# Altium schematic symbol library Capacitor - Ceramic - Sumsung.SchLib: 1421 symbols (part 7 of 8) (continued)
## CL31C270JHFNNNE (continued)
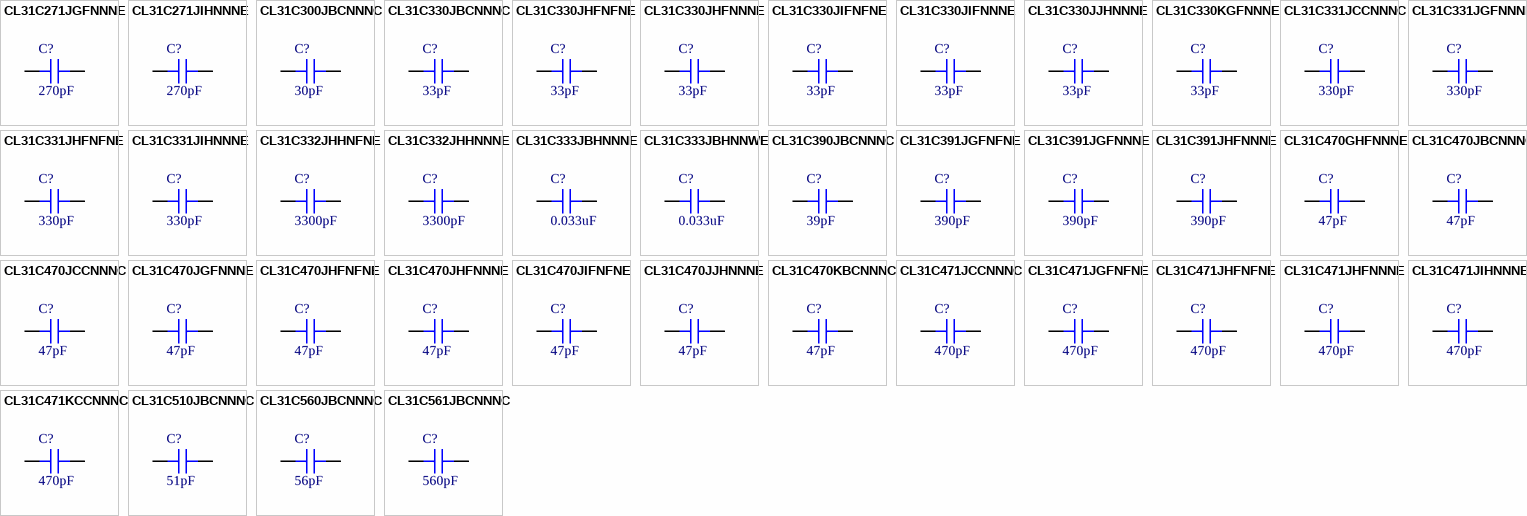
[diagram p31: symbols CL31C271JGFNNNE to CL31C561JBCNNNC]

## CL31C271JGFNNNE
designator C?, comment 270pF
CAP CER 270PF 500V NP0 1206; Part Number: CL31C271JGFNNNE; Manufacturer: Samsung Electro-Mechanics America, Inc.; TemperatureRange: -55C ~ 125C; TemperatureCoefficient: C0G, NP0; Tolerance: 5%; Value: 270pF; PartId: 15412; Supplier 1: Digi-Key; Supplier Part Number 1: 1276-3242-2-ND; ComponentLink1Description: Datasheet; ComponentLink1URL: http://www.samsungsem.com/kr/support/product-search/mlcc/CL31C271JGFNNNE.jsp; ComponentLink2Description: Digi-Key Listing; ComponentLink2URL: https://www.digikey.com/product-detail/en/samsung-electro-mechanics-america-inc/CL31C271JGFNNNE/1276-3242-2-ND/3888900; Voltage: 500V; Price: 0.06; Device Package: 1206 (3216 Metric)
footprint CAP 1206/3216
pins: 1, 2

## CL31C271JIHNNNE
designator C?, comment 270pF
CAP CER 270PF 1KV NP0 1206; Part Number: CL31C271JIHNNNE; Manufacturer: Samsung Electro-Mechanics America, Inc.; TemperatureRange: -55C ~ 125C; TemperatureCoefficient: C0G, NP0; Tolerance: 5%; Voltage: 1000V (1kV); Value: 270pF; PartId: 15401; Supplier 1: Digi-Key; Supplier Part Number 1: 1276-3244-2-ND; ComponentLink1Description: Datasheet; ComponentLink1URL: http://www.samsungsem.com/kr/support/product-search/mlcc/CL31C271JIHNNNE.jsp; ComponentLink2Description: Digi-Key Listing; ComponentLink2URL: https://www.digikey.com/product-detail/en/samsung-electro-mechanics-america-inc/CL31C271JIHNNNE/1276-3244-2-ND/3888902; Price: 0.0547; Device Package: 1206 (3216 Metric)
footprint CAP 1206/3216
pins: 1, 2

## CL31C300JBCNNNC
designator C?, comment 30pF
CAP CER 30PF 50V NP0 1206; Part Number: CL31C300JBCNNNC; Manufacturer: Samsung Electro-Mechanics America, Inc.; TemperatureRange: -55C ~ 125C; TemperatureCoefficient: C0G, NP0; Tolerance: 5%; Value: 30pF; PartId: 17084; Supplier 1: Digi-Key; Supplier Part Number 1: 1276-2830-2-ND; ComponentLink1Description: Datasheet; ComponentLink1URL: http://www.samsungsem.com/kr/support/product-search/mlcc/__icsFiles/afieldfile/2016/08/18/S_CL31C300JBCNNNC.pdf; ComponentLink2Description: Digi-Key Listing; ComponentLink2URL: https://www.digikey.com/product-detail/en/samsung-electro-mechanics-america-inc/CL31C300JBCNNNC/1276-2830-2-ND/3888488; Voltage: 50V; Price: 0.0131; Device Package: 1206 (3216 Metric)
footprint CAP 1206/3216 - 1.0MM
pins: 1, 2

## CL31C330JBCNNNC
designator C?, comment 33pF
CAP CER 33PF 50V NP0 1206; Part Number: CL31C330JBCNNNC; Manufacturer: Samsung Electro-Mechanics America, Inc.; TemperatureRange: -55C ~ 125C; TemperatureCoefficient: C0G, NP0; Tolerance: 5%; Value: 33pF; PartId: 16961; Supplier 1: Digi-Key; Supplier Part Number 1: 1276-1252-2-ND; ComponentLink1Description: Datasheet; ComponentLink1URL: http://www.samsungsem.com/kr/support/product-search/mlcc/__icsFiles/afieldfile/2016/08/18/S_CL31C330JBCNNNC.pdf; ComponentLink2Description: Digi-Key Listing; ComponentLink2URL: https://www.digikey.com/product-detail/en/samsung-electro-mechanics-america-inc/CL31C330JBCNNNC/1276-1252-2-ND/3886910; Voltage: 50V; Price: 0.0356; Device Package: 1206 (3216 Metric)
footprint CAP 1206/3216 - 1.0MM
pins: 1, 2

## CL31C330JHFNFNE
designator C?, comment 33pF
CAP CER 33PF 630V NP0 1206; Part Number: CL31C330JHFNFNE; Manufacturer: Samsung Electro-Mechanics America, Inc.; TemperatureRange: -55C ~ 125C; TemperatureCoefficient: C0G, NP0; Tolerance: 5%; Value: 33pF; PartId: 15468; Supplier 1: Digi-Key; Supplier Part Number 1: 1276-3247-2-ND; ComponentLink1Description: Datasheet; ComponentLink1URL: http://www.samsungsem.com/kr/support/product-search/mlcc/CL31C330JHFNFNE.jsp; ComponentLink2Description: Digi-Key Listing; ComponentLink2URL: https://www.digikey.com/product-detail/en/samsung-electro-mechanics-america-inc/CL31C330JHFNFNE/1276-3247-2-ND/3888905; Voltage: 630V; Price: 0.0779; Device Package: 1206 (3216 Metric)
footprint CAP 1206/3216
pins: 1, 2

## CL31C330JHFNNNE
designator C?, comment 33pF
CAP CER 33PF 630V NP0 1206; Part Number: CL31C330JHFNNNE; Manufacturer: Samsung Electro-Mechanics America, Inc.; TemperatureRange: -55C ~ 125C; TemperatureCoefficient: C0G, NP0; Tolerance: 5%; Value: 33pF; PartId: 15469; Supplier 1: Digi-Key; Supplier Part Number 1: 1276-3248-2-ND; ComponentLink1Description: Datasheet; ComponentLink1URL: http://www.samsungsem.com/kr/support/product-search/mlcc/CL31C330JHFNNNE.jsp; ComponentLink2Description: Digi-Key Listing; ComponentLink2URL: https://www.digikey.com/product-detail/en/samsung-electro-mechanics-america-inc/CL31C330JHFNNNE/1276-3248-2-ND/3888906; Voltage: 630V; Price: 0.0779; Device Package: 1206 (3216 Metric)
footprint CAP 1206/3216
pins: 1, 2

## CL31C330JIFNFNE
designator C?, comment 33pF
CAP CER 33PF 1KV NP0 1206; Part Number: CL31C330JIFNFNE; Manufacturer: Samsung Electro-Mechanics America, Inc.; TemperatureRange: -55C ~ 125C; TemperatureCoefficient: C0G, NP0; Tolerance: 5%; Voltage: 1000V (1kV); Value: 33pF; PartId: 15507; Supplier 1: Digi-Key; Supplier Part Number 1: 1276-3249-2-ND; ComponentLink1Description: Datasheet; ComponentLink1URL: http://www.samsungsem.com/kr/support/product-search/mlcc/CL31C330JIFNFNE.jsp; ComponentLink2Description: Digi-Key Listing; ComponentLink2URL: https://www.digikey.com/product-detail/en/samsung-electro-mechanics-america-inc/CL31C330JIFNFNE/1276-3249-2-ND/3888907; Price: 0.0531; Device Package: 1206 (3216 Metric)
footprint CAP 1206/3216
pins: 1, 2

## CL31C330JIFNNNE
designator C?, comment 33pF
CAP CER 33PF 1KV NP0 1206; Part Number: CL31C330JIFNNNE; Manufacturer: Samsung Electro-Mechanics America, Inc.; TemperatureRange: -55C ~ 125C; TemperatureCoefficient: C0G, NP0; Tolerance: 5%; Voltage: 1000V (1kV); Value: 33pF; PartId: 15426; Supplier 1: Digi-Key; Supplier Part Number 1: 1276-3250-2-ND; ComponentLink1Description: Datasheet; ComponentLink1URL: http://www.samsungsem.com/kr/support/product-search/mlcc/CL31C330JIFNNNE.jsp; ComponentLink2Description: Digi-Key Listing; ComponentLink2URL: https://www.digikey.com/product-detail/en/samsung-electro-mechanics-america-inc/CL31C330JIFNNNE/1276-3250-2-ND/3888908; Price: 0.0975; Device Package: 1206 (3216 Metric)
footprint CAP 1206/3216
pins: 1, 2

## CL31C330JJHNNNE
designator C?, comment 33pF
CAP CER 33PF 2KV NP0 1206; Part Number: CL31C330JJHNNNE; Manufacturer: Samsung Electro-Mechanics America, Inc.; TemperatureRange: -55C ~ 125C; TemperatureCoefficient: C0G, NP0; Tolerance: 5%; Voltage: 2000V (2kV); Value: 33pF; PartId: 15472; Supplier 1: Digi-Key; Supplier Part Number 1: 1276-3251-2-ND; ComponentLink1Description: Datasheet; ComponentLink1URL: http://www.samsungsem.com/kr/support/product-search/mlcc/CL31C330JJHNNNE.jsp; ComponentLink2Description: Digi-Key Listing; ComponentLink2URL: https://www.digikey.com/product-detail/en/samsung-electro-mechanics-america-inc/CL31C330JJHNNNE/1276-3251-2-ND/3888909; Price: 0.0874; Device Package: 1206 (3216 Metric)
footprint CAP 1206/3216
pins: 1, 2

## CL31C330KGFNNNE
designator C?, comment 33pF
CAP CER 33PF 500V NP0 1206; Part Number: CL31C330KGFNNNE; Manufacturer: Samsung Electro-Mechanics America, Inc.; TemperatureRange: -55C ~ 125C; TemperatureCoefficient: C0G, NP0; Tolerance: 10%; Value: 33pF; PartId: 15505; Supplier 1: Digi-Key; Supplier Part Number 1: 1276-3252-2-ND; ComponentLink1Description: Datasheet; ComponentLink1URL: http://www.samsungsem.com/kr/support/product-search/mlcc/CL31C330KGFNNNE.jsp; ComponentLink2Description: Digi-Key Listing; ComponentLink2URL: https://www.digikey.com/product-detail/en/samsung-electro-mechanics-america-inc/CL31C330KGFNNNE/1276-3252-2-ND/3888910; Voltage: 500V; Price: 0.0519; Device Package: 1206 (3216 Metric)
footprint CAP 1206/3216
pins: 1, 2

## CL31C331JCCNNNC
designator C?, comment 330pF
CAP CER 330PF 100V NP0 1206; Part Number: CL31C331JCCNNNC; Manufacturer: Samsung Electro-Mechanics America, Inc.; TemperatureRange: -55C ~ 125C; TemperatureCoefficient: C0G, NP0; Tolerance: 5%; Value: 330pF; PartId: 17214; Supplier 1: Digi-Key; Supplier Part Number 1: 1276-2832-2-ND; ComponentLink1Description: Datasheet; ComponentLink1URL: http://www.samsungsem.com/kr/support/product-search/mlcc/__icsFiles/afieldfile/2016/08/18/S_CL31C331JCCNNNC.pdf; ComponentLink2Description: Digi-Key Listing; ComponentLink2URL: https://www.digikey.com/product-detail/en/samsung-electro-mechanics-america-inc/CL31C331JCCNNNC/1276-2832-2-ND/3888490; Voltage: 100V; Price: 0.0723; Device Package: 1206 (3216 Metric)
footprint CAP 1206/3216 - 1.0MM
pins: 1, 2

## CL31C331JGFNNNE
designator C?, comment 330pF
CAP CER 330PF 500V NP0 1206; Part Number: CL31C331JGFNNNE; Manufacturer: Samsung Electro-Mechanics America, Inc.; TemperatureRange: -55C ~ 125C; TemperatureCoefficient: C0G, NP0; Tolerance: 5%; Value: 330pF; PartId: 15438; Supplier 1: Digi-Key; Supplier Part Number 1: 1276-3253-2-ND; ComponentLink1Description: Datasheet; ComponentLink1URL: http://www.samsungsem.com/kr/support/product-search/mlcc/CL31C331JGFNNNE.jsp; ComponentLink2Description: Digi-Key Listing; ComponentLink2URL: https://www.digikey.com/product-detail/en/samsung-electro-mechanics-america-inc/CL31C331JGFNNNE/1276-3253-2-ND/3888911; Voltage: 500V; Price: 0.052; Device Package: 1206 (3216 Metric)
footprint CAP 1206/3216
pins: 1, 2

## CL31C331JHFNFNE
designator C?, comment 330pF
CAP CER 330PF 630V NP0 1206; Part Number: CL31C331JHFNFNE; Manufacturer: Samsung Electro-Mechanics America, Inc.; TemperatureRange: -55C ~ 125C; TemperatureCoefficient: C0G, NP0; Tolerance: 5%; Value: 330pF; PartId: 15483; Supplier 1: Digi-Key; Supplier Part Number 1: 1276-3254-2-ND; ComponentLink1Description: Datasheet; ComponentLink1URL: http://www.samsungsem.com/kr/support/product-search/mlcc/CL31C331JHFNFNE.jsp; ComponentLink2Description: Digi-Key Listing; ComponentLink2URL: https://www.digikey.com/product-detail/en/samsung-electro-mechanics-america-inc/CL31C331JHFNFNE/1276-3254-2-ND/3888912; Voltage: 630V; Price: 0.0618; Device Package: 1206 (3216 Metric)
footprint CAP 1206/3216
pins: 1, 2

## CL31C331JIHNNNE
designator C?, comment 330pF
CAP CER 330PF 1KV NP0 1206; Part Number: CL31C331JIHNNNE; Manufacturer: Samsung Electro-Mechanics America, Inc.; TemperatureRange: -55C ~ 125C; TemperatureCoefficient: C0G, NP0; Tolerance: 5%; Voltage: 1000V (1kV); Value: 330pF; PartId: 15427; Supplier 1: Digi-Key; Supplier Part Number 1: 1276-3256-2-ND; ComponentLink1Description: Datasheet; ComponentLink1URL: http://www.samsungsem.com/kr/support/product-search/mlcc/CL31C331JIHNNNE.jsp; ComponentLink2Description: Digi-Key Listing; ComponentLink2URL: https://www.digikey.com/product-detail/en/samsung-electro-mechanics-america-inc/CL31C331JIHNNNE/1276-3256-2-ND/3888914; Price: 0.1252; Device Package: 1206 (3216 Metric)
footprint CAP 1206/3216
pins: 1, 2

## CL31C332JHHNFNE
designator C?, comment 3300pF
CAP CER 3300PF 630V NP0 1206; Part Number: CL31C332JHHNFNE; Manufacturer: Samsung Electro-Mechanics America, Inc.; TemperatureRange: -55C ~ 125C; TemperatureCoefficient: C0G, NP0; Tolerance: 5%; Value: 3300pF; PartId: 15411; Supplier 1: Digi-Key; Supplier Part Number 1: 1276-3259-2-ND; ComponentLink1Description: Datasheet; ComponentLink1URL: http://www.samsungsem.com/kr/support/product-search/mlcc/CL31C332JHHNFNE.jsp; ComponentLink2Description: Digi-Key Listing; ComponentLink2URL: https://www.digikey.com/product-detail/en/samsung-electro-mechanics-america-inc/CL31C332JHHNFNE/1276-3259-2-ND/3888917; Voltage: 630V; Price: 0.0599; Device Package: 1206 (3216 Metric)
footprint CAP 1206/3216
pins: 1, 2

## CL31C332JHHNNNE
designator C?, comment 3300pF
CAP CER 3300PF 630V NP0 1206; Part Number: CL31C332JHHNNNE; Manufacturer: Samsung Electro-Mechanics America, Inc.; TemperatureRange: -55C ~ 125C; TemperatureCoefficient: C0G, NP0; Tolerance: 5%; Value: 3300pF; PartId: 17736; Supplier 1: Digi-Key; Supplier Part Number 1: 1276-6776-2-ND; ComponentLink1Description: Datasheet; ComponentLink1URL: http://www.samsungsem.com/kr/support/product-search/mlcc/__icsFiles/afieldfile/2016/08/18/S_CL31C332JHHNNNE.pdf; ComponentLink2Description: Digi-Key Listing; ComponentLink2URL: https://www.digikey.com/product-detail/en/samsung-electro-mechanics-america-inc/CL31C332JHHNNNE/1276-6776-2-ND/5961260; Voltage: 630V; Price: 0.1446; Device Package: 1206 (3216 Metric)
footprint CAP 1206/3216 - 1.8MM
pins: 1, 2

## CL31C333JBHNNNE
designator C?, comment 0.033uF
CAP CER 0.033UF 50V NP0 1206; Part Number: CL31C333JBHNNNE; Manufacturer: Samsung Electro-Mechanics America, Inc.; TemperatureRange: -55C ~ 125C; TemperatureCoefficient: C0G, NP0; Tolerance: 5%; Value: 0.033uF; PartId: 17542; Supplier 1: Digi-Key; Supplier Part Number 1: 1276-3260-2-ND; ComponentLink1Description: Datasheet; ComponentLink1URL: http://www.samsungsem.com/kr/support/product-search/mlcc/__icsFiles/afieldfile/2016/08/18/S_CL31C333JBHNNNE.pdf; ComponentLink2Description: Digi-Key Listing; ComponentLink2URL: https://www.digikey.com/product-detail/en/samsung-electro-mechanics-america-inc/CL31C333JBHNNNE/1276-3260-2-ND/3888918; Voltage: 50V; Price: 0.1576; Device Package: 1206 (3216 Metric)
footprint CAP 1206/3216 - 1.8MM
pins: 1, 2

## CL31C333JBHNNWE
designator C?, comment 0.033uF
CAP CER 0.033UF 50V NP0 1206; Part Number: CL31C333JBHNNWE; Manufacturer: Samsung Electro-Mechanics America, Inc.; TemperatureRange: -55C ~ 125C; TemperatureCoefficient: C0G, NP0; Tolerance: 5%; Value: 0.033uF; PartId: 17859; Supplier 1: Digi-Key; Supplier Part Number 1: 1276-3261-2-ND; ComponentLink1Description: Datasheet; ComponentLink1URL: http://www.samsungsem.com/kr/support/product-search/mlcc/__icsFiles/afieldfile/2016/08/18/S_CL31C333JBHNNWE.pdf; ComponentLink2Description: Digi-Key Listing; ComponentLink2URL: https://www.digikey.com/product-detail/en/samsung-electro-mechanics-america-inc/CL31C333JBHNNWE/1276-3261-2-ND/3888919; Voltage: 50V; Price: 0.1576; Device Package: 1206 (3216 Metric)
footprint CAP 1206/3216 - 1.8MM
pins: 1, 2

## CL31C390JBCNNNC
designator C?, comment 39pF
CAP CER 39PF 50V NP0 1206; Part Number: CL31C390JBCNNNC; Manufacturer: Samsung Electro-Mechanics America, Inc.; TemperatureRange: -55C ~ 125C; TemperatureCoefficient: C0G, NP0; Tolerance: 5%; Value: 39pF; PartId: 17158; Supplier 1: Digi-Key; Supplier Part Number 1: 1276-1265-2-ND; ComponentLink1Description: Datasheet; ComponentLink1URL: http://www.samsungsem.com/kr/support/product-search/mlcc/__icsFiles/afieldfile/2016/08/18/S_CL31C390JBCNNNC.pdf; ComponentLink2Description: Digi-Key Listing; ComponentLink2URL: https://www.digikey.com/product-detail/en/samsung-electro-mechanics-america-inc/CL31C390JBCNNNC/1276-1265-2-ND/3886923; Voltage: 50V; Price: 0.0369; Device Package: 1206 (3216 Metric)
footprint CAP 1206/3216 - 1.0MM
pins: 1, 2

## CL31C391JGFNFNE
designator C?, comment 390pF
CAP CER 390PF 500V NP0 1206; Part Number: CL31C391JGFNFNE; Manufacturer: Samsung Electro-Mechanics America, Inc.; TemperatureRange: -55C ~ 125C; TemperatureCoefficient: C0G, NP0; Tolerance: 5%; Value: 390pF; PartId: 15497; Supplier 1: Digi-Key; Supplier Part Number 1: 1276-3262-2-ND; ComponentLink1Description: Datasheet; ComponentLink1URL: http://www.samsungsem.com/kr/support/product-search/mlcc/CL31C391JGFNFNE.jsp; ComponentLink2Description: Digi-Key Listing; ComponentLink2URL: https://www.digikey.com/product-detail/en/samsung-electro-mechanics-america-inc/CL31C391JGFNFNE/1276-3262-2-ND/3888920; Voltage: 500V; Price: 0.0618; Device Package: 1206 (3216 Metric)
footprint CAP 1206/3216
pins: 1, 2

## CL31C391JGFNNNE
designator C?, comment 390pF
CAP CER 390PF 500V NP0 1206; Part Number: CL31C391JGFNNNE; Manufacturer: Samsung Electro-Mechanics America, Inc.; TemperatureRange: -55C ~ 125C; TemperatureCoefficient: C0G, NP0; Tolerance: 5%; Value: 390pF; PartId: 15496; Supplier 1: Digi-Key; Supplier Part Number 1: 1276-3263-2-ND; ComponentLink1Description: Datasheet; ComponentLink1URL: http://www.samsungsem.com/kr/support/product-search/mlcc/CL31C391JGFNNNE.jsp; ComponentLink2Description: Digi-Key Listing; ComponentLink2URL: https://www.digikey.com/product-detail/en/samsung-electro-mechanics-america-inc/CL31C391JGFNNNE/1276-3263-2-ND/3888921; Voltage: 500V; Price: 0.06; Device Package: 1206 (3216 Metric)
footprint CAP 1206/3216
pins: 1, 2

## CL31C391JHFNNNE
designator C?, comment 390pF
CAP CER 390PF 630V NP0 1206; Part Number: CL31C391JHFNNNE; Manufacturer: Samsung Electro-Mechanics America, Inc.; TemperatureRange: -55C ~ 125C; TemperatureCoefficient: C0G, NP0; Tolerance: 5%; Value: 390pF; PartId: 15459; Supplier 1: Digi-Key; Supplier Part Number 1: 1276-3264-2-ND; ComponentLink1Description: Datasheet; ComponentLink1URL: http://www.samsungsem.com/kr/support/library/product-catalog/__icsFiles/afieldfile/2015/11/18/MLCC.pdf; ComponentLink2Description: Digi-Key Listing; ComponentLink2URL: https://www.digikey.com/product-detail/en/samsung-electro-mechanics-america-inc/CL31C391JHFNNNE/1276-3264-2-ND/3888922; Voltage: 630V; Price: 0.06; Device Package: 1206 (3216 Metric)
footprint CAP 1206/3216
pins: 1, 2

## CL31C470GHFNNNE
designator C?, comment 47pF
CAP CER 47PF 630V NP0 1206; Part Number: CL31C470GHFNNNE; Manufacturer: Samsung Electro-Mechanics America, Inc.; TemperatureRange: -55C ~ 125C; TemperatureCoefficient: C0G, NP0; Tolerance: 2%; Value: 47pF; PartId: 15503; Supplier 1: Digi-Key; Supplier Part Number 1: 1276-3266-2-ND; ComponentLink1Description: Datasheet; ComponentLink1URL: http://www.samsungsem.com/kr/support/product-search/mlcc/CL31C470GHFNNNE.jsp; ComponentLink2Description: Digi-Key Listing; ComponentLink2URL: https://www.digikey.com/product-detail/en/samsung-electro-mechanics-america-inc/CL31C470GHFNNNE/1276-3266-2-ND/3888924; Voltage: 630V; Price: 0.1231; Device Package: 1206 (3216 Metric)
footprint CAP 1206/3216
pins: 1, 2

## CL31C470JBCNNNC
designator C?, comment 47pF
CAP CER 47PF 50V NP0 1206; Part Number: CL31C470JBCNNNC; Manufacturer: Samsung Electro-Mechanics America, Inc.; TemperatureRange: -55C ~ 125C; TemperatureCoefficient: C0G, NP0; Tolerance: 5%; Value: 47pF; PartId: 17303; Supplier 1: Digi-Key; Supplier Part Number 1: 1276-2836-2-ND; ComponentLink1Description: Datasheet; ComponentLink1URL: http://www.samsungsem.com/kr/support/product-search/mlcc/__icsFiles/afieldfile/2016/08/18/S_CL31C470JBCNNNC.pdf; ComponentLink2Description: Digi-Key Listing; ComponentLink2URL: https://www.digikey.com/product-detail/en/samsung-electro-mechanics-america-inc/CL31C470JBCNNNC/1276-2836-2-ND/3888494; Voltage: 50V; Price: 0.0353; Device Package: 1206 (3216 Metric)
footprint CAP 1206/3216 - 1.0MM
pins: 1, 2

## CL31C470JCCNNNC
designator C?, comment 47pF
CAP CER 47PF 100V NP0 1206; Part Number: CL31C470JCCNNNC; Manufacturer: Samsung Electro-Mechanics America, Inc.; TemperatureRange: -55C ~ 125C; TemperatureCoefficient: C0G, NP0; Tolerance: 5%; Value: 47pF; PartId: 17152; Supplier 1: Digi-Key; Supplier Part Number 1: 1276-2837-2-ND; ComponentLink1Description: Datasheet; ComponentLink1URL: //media.digikey.com/pdf/Data%20Sheets/Samsung%20PDFs/CL31C470JCCNNNC_spec.pdf; ComponentLink2Description: Digi-Key Listing; ComponentLink2URL: https://www.digikey.com/product-detail/en/samsung-electro-mechanics-america-inc/CL31C470JCCNNNC/1276-2837-2-ND/3888495; Voltage: 100V; Price: 0.0171; Device Package: 1206 (3216 Metric)
footprint CAP 1206/3216 - 1.0MM
pins: 1, 2

## CL31C470JGFNNNE
designator C?, comment 47pF
CAP CER 47PF 500V NP0 1206; Part Number: CL31C470JGFNNNE; Manufacturer: Samsung Electro-Mechanics America, Inc.; TemperatureRange: -55C ~ 125C; TemperatureCoefficient: C0G, NP0; Tolerance: 5%; Value: 47pF; PartId: 15430; Supplier 1: Digi-Key; Supplier Part Number 1: 1276-3267-2-ND; ComponentLink1Description: Datasheet; ComponentLink1URL: http://www.samsungsem.com/kr/support/product-search/mlcc/CL31C470JGFNNNE.jsp; ComponentLink2Description: Digi-Key Listing; ComponentLink2URL: https://www.digikey.com/product-detail/en/samsung-electro-mechanics-america-inc/CL31C470JGFNNNE/1276-3267-2-ND/3888925; Voltage: 500V; Price: 0.042; Device Package: 1206 (3216 Metric)
footprint CAP 1206/3216
pins: 1, 2

## CL31C470JHFNFNE
designator C?, comment 47pF
CAP CER 47PF 630V NP0 1206; Part Number: CL31C470JHFNFNE; Manufacturer: Samsung Electro-Mechanics America, Inc.; TemperatureRange: -55C ~ 125C; TemperatureCoefficient: C0G, NP0; Tolerance: 5%; Value: 47pF; PartId: 15486; Supplier 1: Digi-Key; Supplier Part Number 1: 1276-3268-2-ND; ComponentLink1Description: Datasheet; ComponentLink1URL: http://www.samsungsem.com/kr/support/product-search/mlcc/CL31C470JHFNFNE.jsp; ComponentLink2Description: Digi-Key Listing; ComponentLink2URL: https://www.digikey.com/product-detail/en/samsung-electro-mechanics-america-inc/CL31C470JHFNFNE/1276-3268-2-ND/3888926; Voltage: 630V; Price: 0.0834; Device Package: 1206 (3216 Metric)
footprint CAP 1206/3216
pins: 1, 2

## CL31C470JHFNNNE
designator C?, comment 47pF
CAP CER 47PF 630V NP0 1206; Part Number: CL31C470JHFNNNE; Manufacturer: Samsung Electro-Mechanics America, Inc.; TemperatureRange: -55C ~ 125C; TemperatureCoefficient: C0G, NP0; Tolerance: 5%; Value: 47pF; PartId: 15418; Supplier 1: Digi-Key; Supplier Part Number 1: 1276-3269-2-ND; ComponentLink1Description: Datasheet; ComponentLink1URL: http://www.samsungsem.com/kr/support/product-search/mlcc/CL31C470JHFNNNE.jsp; ComponentLink2Description: Digi-Key Listing; ComponentLink2URL: https://www.digikey.com/product-detail/en/samsung-electro-mechanics-america-inc/CL31C470JHFNNNE/1276-3269-2-ND/3888927; Voltage: 630V; Price: 0.0709; Device Package: 1206 (3216 Metric)
footprint CAP 1206/3216
pins: 1, 2

## CL31C470JIFNFNE
designator C?, comment 47pF
CAP CER 47PF 1KV NP0 1206; Part Number: CL31C470JIFNFNE; Manufacturer: Samsung Electro-Mechanics America, Inc.; TemperatureRange: -55C ~ 125C; TemperatureCoefficient: C0G, NP0; Tolerance: 5%; Voltage: 1000V (1kV); Value: 47pF; PartId: 15404; Supplier 1: Digi-Key; Supplier Part Number 1: 1276-3270-2-ND; ComponentLink1Description: Datasheet; ComponentLink1URL: http://www.samsungsem.com/kr/support/product-search/mlcc/CL31C470JIFNFNE.jsp; ComponentLink2Description: Digi-Key Listing; ComponentLink2URL: https://www.digikey.com/product-detail/en/samsung-electro-mechanics-america-inc/CL31C470JIFNFNE/1276-3270-2-ND/3888928; Price: 0.0374; Device Package: 1206 (3216 Metric)
footprint CAP 1206/3216
pins: 1, 2

## CL31C470JJHNNNE
designator C?, comment 47pF
CAP CER 47PF 2KV NP0 1206; Part Number: CL31C470JJHNNNE; Manufacturer: Samsung Electro-Mechanics America, Inc.; TemperatureRange: -55C ~ 125C; TemperatureCoefficient: C0G, NP0; Tolerance: 5%; Voltage: 2000V (2kV); Value: 47pF; PartId: 15487; Supplier 1: Digi-Key; Supplier Part Number 1: 1276-3272-2-ND; ComponentLink1Description: Datasheet; ComponentLink1URL: http://www.samsungsem.com/kr/support/product-search/mlcc/CL31C470JJHNNNE.jsp; ComponentLink2Description: Digi-Key Listing; ComponentLink2URL: https://www.digikey.com/product-detail/en/samsung-electro-mechanics-america-inc/CL31C470JJHNNNE/1276-3272-2-ND/3888930; Price: 0.0874; Device Package: 1206 (3216 Metric)
footprint CAP 1206/3216
pins: 1, 2

## CL31C470KBCNNNC
designator C?, comment 47pF
CAP CER 47PF 50V NP0 1206; Part Number: CL31C470KBCNNNC; Manufacturer: Samsung Electro-Mechanics America, Inc.; TemperatureRange: -55C ~ 125C; TemperatureCoefficient: C0G, NP0; Tolerance: 10%; Value: 47pF; PartId: 17290; Supplier 1: Digi-Key; Supplier Part Number 1: 1276-2839-2-ND; ComponentLink1Description: Datasheet; ComponentLink1URL: http://www.samsungsem.com/kr/support/product-search/mlcc/__icsFiles/afieldfile/2016/08/18/S_CL31C470KBCNNNC.pdf; ComponentLink2Description: Digi-Key Listing; ComponentLink2URL: https://www.digikey.com/product-detail/en/samsung-electro-mechanics-america-inc/CL31C470KBCNNNC/1276-2839-2-ND/3888497; Voltage: 50V; Price: 0.0346; Device Package: 1206 (3216 Metric)
footprint CAP 1206/3216 - 1.0MM
pins: 1, 2

## CL31C471JCCNNNC
designator C?, comment 470pF
CAP CER 470PF 100V NP0 1206; Part Number: CL31C471JCCNNNC; Manufacturer: Samsung Electro-Mechanics America, Inc.; TemperatureRange: -55C ~ 125C; TemperatureCoefficient: C0G, NP0; Tolerance: 5%; Value: 470pF; PartId: 17211; Supplier 1: Digi-Key; Supplier Part Number 1: 1276-2840-2-ND; ComponentLink1Description: Datasheet; ComponentLink1URL: http://www.samsungsem.com/kr/support/product-search/mlcc/__icsFiles/afieldfile/2016/08/18/S_CL31C471JCCNNNC.pdf; ComponentLink2Description: Digi-Key Listing; ComponentLink2URL: https://www.digikey.com/product-detail/en/samsung-electro-mechanics-america-inc/CL31C471JCCNNNC/1276-2840-2-ND/3888498; Voltage: 100V; Price: 0.0783; Device Package: 1206 (3216 Metric)
footprint CAP 1206/3216 - 1.0MM
pins: 1, 2

## CL31C471JGFNFNE
designator C?, comment 470pF
CAP CER 470PF 500V NP0 1206; Part Number: CL31C471JGFNFNE; Manufacturer: Samsung Electro-Mechanics America, Inc.; TemperatureRange: -55C ~ 125C; TemperatureCoefficient: C0G, NP0; Tolerance: 5%; Value: 470pF; PartId: 15482; Supplier 1: Digi-Key; Supplier Part Number 1: 1276-3274-2-ND; ComponentLink1Description: Datasheet; ComponentLink1URL: http://www.samsungsem.com/kr/support/product-search/mlcc/CL31C471JGFNFNE.jsp; ComponentLink2Description: Digi-Key Listing; ComponentLink2URL: https://www.digikey.com/product-detail/en/samsung-electro-mechanics-america-inc/CL31C471JGFNFNE/1276-3274-2-ND/3888932; Voltage: 500V; Price: 0.0563; Device Package: 1206 (3216 Metric)
footprint CAP 1206/3216
pins: 1, 2

## CL31C471JHFNFNE
designator C?, comment 470pF
CAP CER 470PF 630V NP0 1206; Part Number: CL31C471JHFNFNE; Manufacturer: Samsung Electro-Mechanics America, Inc.; TemperatureRange: -55C ~ 125C; TemperatureCoefficient: C0G, NP0; Tolerance: 5%; Value: 470pF; PartId: 15453; Supplier 1: Digi-Key; Supplier Part Number 1: 1276-3277-2-ND; ComponentLink1Description: Datasheet; ComponentLink1URL: http://www.samsungsem.com/kr/support/product-search/mlcc/CL31C471JHFNFNE.jsp; ComponentLink2Description: Digi-Key Listing; ComponentLink2URL: https://www.digikey.com/product-detail/en/samsung-electro-mechanics-america-inc/CL31C471JHFNFNE/1276-3277-2-ND/3888935; Voltage: 630V; Price: 0.0582; Device Package: 1206 (3216 Metric)
footprint CAP 1206/3216
pins: 1, 2

## CL31C471JHFNNNE
designator C?, comment 470pF
CAP CER 470PF 630V NP0 1206; Part Number: CL31C471JHFNNNE; Manufacturer: Samsung Electro-Mechanics America, Inc.; TemperatureRange: -55C ~ 125C; TemperatureCoefficient: C0G, NP0; Tolerance: 5%; Value: 470pF; PartId: 15454; Supplier 1: Digi-Key; Supplier Part Number 1: 1276-3278-2-ND; ComponentLink1Description: Datasheet; ComponentLink1URL: http://www.samsungsem.com/kr/support/product-search/mlcc/CL31C471JHFNNNE.jsp; ComponentLink2Description: Digi-Key Listing; ComponentLink2URL: https://www.digikey.com/product-detail/en/samsung-electro-mechanics-america-inc/CL31C471JHFNNNE/1276-3278-2-ND/3888936; Voltage: 630V; Price: 0.0582; Device Package: 1206 (3216 Metric)
footprint CAP 1206/3216
pins: 1, 2

## CL31C471JIHNNNE
designator C?, comment 470pF
CAP CER 470PF 1KV NP0 1206; Part Number: CL31C471JIHNNNE; Manufacturer: Samsung Electro-Mechanics America, Inc.; TemperatureRange: -55C ~ 125C; TemperatureCoefficient: C0G, NP0; Tolerance: 5%; Voltage: 1000V (1kV); Value: 470pF; PartId: 17928; Supplier 1: Digi-Key; Supplier Part Number 1: 1276-3279-2-ND; ComponentLink1Description: Datasheet; ComponentLink1URL: http://www.samsungsem.com/kr/support/product-search/mlcc/__icsFiles/afieldfile/2016/08/18/S_CL31C471JIHNNNE.pdf; ComponentLink2Description: Digi-Key Listing; ComponentLink2URL: https://www.digikey.com/product-detail/en/samsung-electro-mechanics-america-inc/CL31C471JIHNNNE/1276-3279-2-ND/3888937; Price: 0.1926; Device Package: 1206 (3216 Metric)
footprint CAP 1206/3216 - 1.8MM
pins: 1, 2

## CL31C471KCCNNNC
designator C?, comment 470pF
CAP CER 470PF 100V NP0 1206; Part Number: CL31C471KCCNNNC; Manufacturer: Samsung Electro-Mechanics America, Inc.; TemperatureRange: -55C ~ 125C; TemperatureCoefficient: C0G, NP0; Tolerance: 10%; Value: 470pF; PartId: 17151; Supplier 1: Digi-Key; Supplier Part Number 1: 1276-2842-2-ND; ComponentLink1Description: Datasheet; ComponentLink1URL: http://www.samsungsem.com/kr/support/product-search/mlcc/__icsFiles/afieldfile/2016/08/18/S_CL31C471KCCNNNC.pdf; ComponentLink2Description: Digi-Key Listing; ComponentLink2URL: https://www.digikey.com/product-detail/en/samsung-electro-mechanics-america-inc/CL31C471KCCNNNC/1276-2842-2-ND/3888500; Voltage: 100V; Price: 0.0256; Device Package: 1206 (3216 Metric)
footprint CAP 1206/3216 - 1.0MM
pins: 1, 2

## CL31C510JBCNNNC
designator C?, comment 51pF
CAP CER 51PF 50V NP0 1206; Part Number: CL31C510JBCNNNC; Manufacturer: Samsung Electro-Mechanics America, Inc.; TemperatureRange: -55C ~ 125C; TemperatureCoefficient: C0G, NP0; Tolerance: 5%; Value: 51pF; PartId: 17298; Supplier 1: Digi-Key; Supplier Part Number 1: 1276-2844-2-ND; ComponentLink1Description: Datasheet; ComponentLink1URL: http://www.samsungsem.com/kr/support/product-search/mlcc/__icsFiles/afieldfile/2016/08/18/S_CL31C510JBCNNNC.pdf; ComponentLink2Description: Digi-Key Listing; ComponentLink2URL: https://www.digikey.com/product-detail/en/samsung-electro-mechanics-america-inc/CL31C510JBCNNNC/1276-2844-2-ND/3888502; Voltage: 50V; Price: 0.0131; Device Package: 1206 (3216 Metric)
footprint CAP 1206/3216 - 1.0MM
pins: 1, 2

## CL31C560JBCNNNC
designator C?, comment 56pF
CAP CER 56PF 50V NP0 1206; Part Number: CL31C560JBCNNNC; Manufacturer: Samsung Electro-Mechanics America, Inc.; TemperatureRange: -55C ~ 125C; TemperatureCoefficient: C0G, NP0; Tolerance: 5%; Value: 56pF; PartId: 17083; Supplier 1: Digi-Key; Supplier Part Number 1: 1276-1266-2-ND; ComponentLink1Description: Datasheet; ComponentLink1URL: http://www.samsungsem.com/kr/support/product-search/mlcc/__icsFiles/afieldfile/2016/08/18/S_CL31C560JBCNNNC.pdf; ComponentLink2Description: Digi-Key Listing; ComponentLink2URL: https://www.digikey.com/product-detail/en/samsung-electro-mechanics-america-inc/CL31C560JBCNNNC/1276-1266-2-ND/3886924; Voltage: 50V; Price: 0.033; Device Package: 1206 (3216 Metric)
footprint CAP 1206/3216 - 1.0MM
pins: 1, 2

## CL31C561JBCNNNC
designator C?, comment 560pF
CAP CER 560PF 50V NP0 1206; Part Number: CL31C561JBCNNNC; Manufacturer: Samsung Electro-Mechanics America, Inc.; TemperatureRange: -55C ~ 125C; TemperatureCoefficient: C0G, NP0; Tolerance: 5%; Value: 560pF; PartId: 17162; Supplier 1: Digi-Key; Supplier Part Number 1: 1276-2845-2-ND; ComponentLink1Description: Datasheet; ComponentLink1URL: http://www.samsungsem.com/kr/support/product-search/mlcc/__icsFiles/afieldfile/2016/08/18/S_CL31C561JBCNNNC.pdf; ComponentLink2Description: Digi-Key Listing; ComponentLink2URL: https://www.digikey.com/product-detail/en/samsung-electro-mechanics-america-inc/CL31C561JBCNNNC/1276-2845-2-ND/3888503; Voltage: 50V; Price: 0.0511; Device Package: 1206 (3216 Metric)
footprint CAP 1206/3216 - 1.0MM
pins: 1, 2

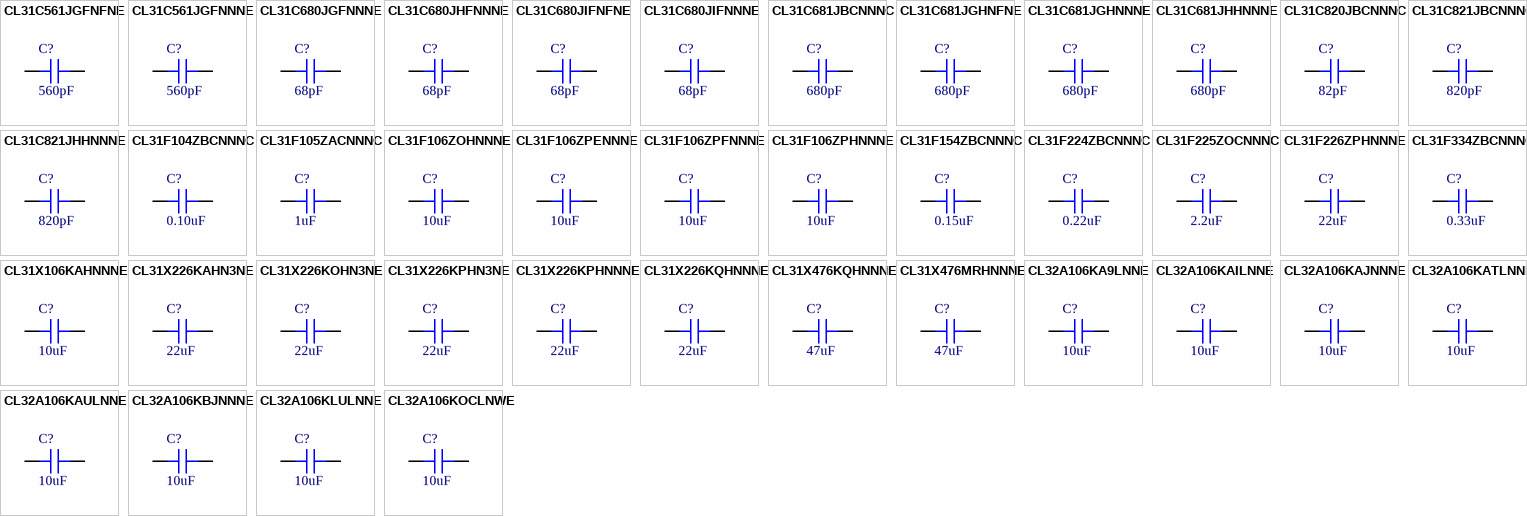
[diagram p32: symbols CL31C561JGFNFNE to CL32A106KOCLNWE]

## CL31C561JGFNFNE
designator C?, comment 560pF
CAP CER 560PF 500V NP0 1206; Part Number: CL31C561JGFNFNE; Manufacturer: Samsung Electro-Mechanics America, Inc.; TemperatureRange: -55C ~ 125C; TemperatureCoefficient: C0G, NP0; Tolerance: 5%; Value: 560pF; PartId: 15498; Supplier 1: Digi-Key; Supplier Part Number 1: 1276-3282-2-ND; ComponentLink1Description: Datasheet; ComponentLink1URL: http://www.samsungsem.com/kr/support/product-search/mlcc/CL31C561JGFNFNE.jsp; ComponentLink2Description: Digi-Key Listing; ComponentLink2URL: https://www.digikey.com/product-detail/en/samsung-electro-mechanics-america-inc/CL31C561JGFNFNE/1276-3282-2-ND/3888940; Voltage: 500V; Price: 0.0721; Device Package: 1206 (3216 Metric)
footprint CAP 1206/3216
pins: 1, 2

## CL31C561JGFNNNE
designator C?, comment 560pF
CAP CER 560PF 500V NP0 1206; Part Number: CL31C561JGFNNNE; Manufacturer: Samsung Electro-Mechanics America, Inc.; TemperatureRange: -55C ~ 125C; TemperatureCoefficient: C0G, NP0; Tolerance: 5%; Value: 560pF; PartId: 15458; Supplier 1: Digi-Key; Supplier Part Number 1: 1276-3283-2-ND; ComponentLink1Description: Datasheet; ComponentLink1URL: http://www.samsungsem.com/kr/support/product-search/mlcc/CL31C561JGFNNNE.jsp; ComponentLink2Description: Digi-Key Listing; ComponentLink2URL: https://www.digikey.com/product-detail/en/samsung-electro-mechanics-america-inc/CL31C561JGFNNNE/1276-3283-2-ND/3888941; Voltage: 500V; Price: 0.06; Device Package: 1206 (3216 Metric)
footprint CAP 1206/3216
pins: 1, 2

## CL31C680JGFNNNE
designator C?, comment 68pF
CAP CER 68PF 500V NP0 1206; Part Number: CL31C680JGFNNNE; Manufacturer: Samsung Electro-Mechanics America, Inc.; TemperatureRange: -55C ~ 125C; TemperatureCoefficient: C0G, NP0; Tolerance: 5%; Value: 68pF; PartId: 17766; Supplier 1: Digi-Key; Supplier Part Number 1: 1276-6633-2-ND; ComponentLink1Description: Datasheet; ComponentLink1URL: http://www.samsungsem.com/kr/support/product-search/mlcc/__icsFiles/afieldfile/2016/08/18/S_CL31C680JGFNNNE.pdf; ComponentLink2Description: Digi-Key Listing; ComponentLink2URL: https://www.digikey.com/product-detail/en/samsung-electro-mechanics-america-inc/CL31C680JGFNNNE/1276-6633-2-ND/5961117; Voltage: 500V; Price: 0.0519; Device Package: 1206 (3216 Metric)
footprint CAP 1206/3216 - 1.8MM
pins: 1, 2

## CL31C680JHFNNNE
designator C?, comment 68pF
CAP CER 68PF 630V NP0 1206; Part Number: CL31C680JHFNNNE; Manufacturer: Samsung Electro-Mechanics America, Inc.; TemperatureRange: -55C ~ 125C; TemperatureCoefficient: C0G, NP0; Tolerance: 5%; Value: 68pF; PartId: 15421; Supplier 1: Digi-Key; Supplier Part Number 1: 1276-3284-2-ND; ComponentLink1Description: Datasheet; ComponentLink1URL: http://www.samsungsem.com/kr/support/product-search/mlcc/CL31C680JHFNNNE.jsp; ComponentLink2Description: Digi-Key Listing; ComponentLink2URL: https://www.digikey.com/product-detail/en/samsung-electro-mechanics-america-inc/CL31C680JHFNNNE/1276-3284-2-ND/3888942; Voltage: 630V; Price: 0.0779; Device Package: 1206 (3216 Metric)
footprint CAP 1206/3216
pins: 1, 2

## CL31C680JIFNFNE
designator C?, comment 68pF
CAP CER 68PF 1KV NP0 1206; Part Number: CL31C680JIFNFNE; Manufacturer: Samsung Electro-Mechanics America, Inc.; TemperatureRange: -55C ~ 125C; TemperatureCoefficient: C0G, NP0; Tolerance: 5%; Voltage: 1000V (1kV); Value: 68pF; PartId: 15405; Supplier 1: Digi-Key; Supplier Part Number 1: 1276-3285-2-ND; ComponentLink1Description: Datasheet; ComponentLink1URL: http://www.samsungsem.com/kr/support/product-search/mlcc/CL31C680JIFNFNE.jsp; ComponentLink2Description: Digi-Key Listing; ComponentLink2URL: https://www.digikey.com/product-detail/en/samsung-electro-mechanics-america-inc/CL31C680JIFNFNE/1276-3285-2-ND/3888943; Price: 0.0473; Device Package: 1206 (3216 Metric)
footprint CAP 1206/3216
pins: 1, 2

## CL31C680JIFNNNE
designator C?, comment 68pF
CAP CER 68PF 1KV NP0 1206; Part Number: CL31C680JIFNNNE; Manufacturer: Samsung Electro-Mechanics America, Inc.; TemperatureRange: -55C ~ 125C; TemperatureCoefficient: C0G, NP0; Tolerance: 5%; Voltage: 1000V (1kV); Value: 68pF; PartId: 15462; Supplier 1: Digi-Key; Supplier Part Number 1: 1276-3286-2-ND; ComponentLink1Description: Datasheet; ComponentLink1URL: http://www.samsungsem.com/kr/support/product-search/mlcc/CL31C680JIFNNNE.jsp; ComponentLink2Description: Digi-Key Listing; ComponentLink2URL: https://www.digikey.com/product-detail/en/samsung-electro-mechanics-america-inc/CL31C680JIFNNNE/1276-3286-2-ND/3888944; Price: 0.0639; Device Package: 1206 (3216 Metric)
footprint CAP 1206/3216
pins: 1, 2

## CL31C681JBCNNNC
designator C?, comment 680pF